# Altium footprint library OT Library.PcbLib: 396 footprints (part 13 of 25)
Each footprint in its own frame and in the unit in brackets; x right, y up, seen from the top. Pads: shape width x height; smd on the part's side, far side on the other; paste and mask are expansions set on the pad; w line width, h text height; cw(c..) or ccw(c..) is an arc to the next point about the centre after c.
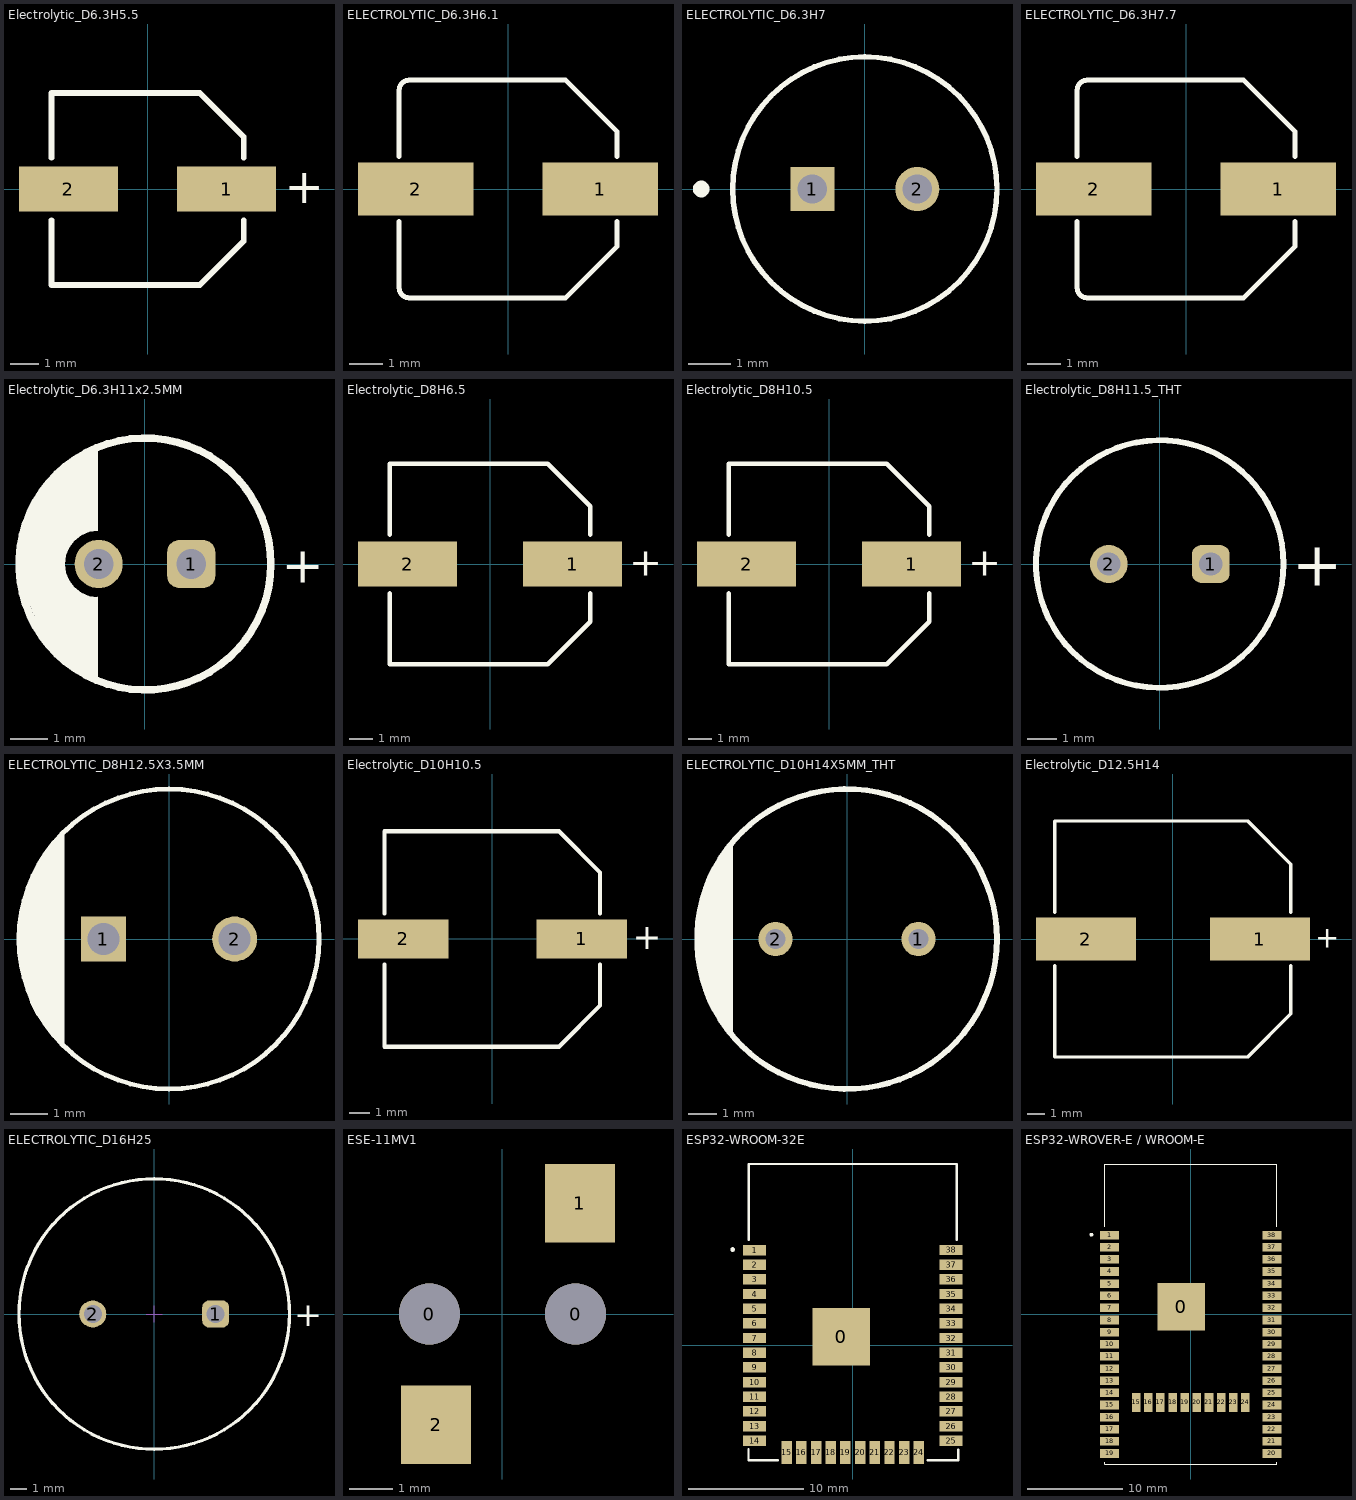
[diagram p12: the footprints below, top view; thin cyan lines are the x and y axes]

## Electrolytic_D6.3H5.5 [mm] "Aluminium Electrolytic V-Chip SMT Capacitors, 6.3x5.5mm"
height 5.5
pads (2):
  rect 3.5x1.6 smd: 1(2.8,0) 2(-2.8,0)
Top Overlay:
  lines w0.2: -3.4,-1.1 -3.4,-3.4 1.85,-3.4 3.4,-1.85 3.4,-1.1 ; -3.4,1.1 -3.4,3.4 1.85,3.4 3.4,1.85 3.4,1.1
  text "+" at 4.85,-0.5 h1.22
3D body: height 5.5, standoff 0, extent -3.65,-3.3 3.65,3.3

## ELECTROLYTIC_D6.3H6.1 [mm] "Aluminium Electrolytic V-Chip SMT Capacitors, 6.3x6.1mm"
height 6.1
pads (2):
  rect 3.5x1.6 smd: 1(2.8,0) 2(-2.8,0)
Top Overlay:
  lines w0.15: -3.3,-3 ccw(c-3,-3) -3,-3.3 1.75,-3.3 3.3,-1.75 3.3,-0.98 ; -3.3,-2.99 -3.3,-0.98 ; -3.3,0.98 -3.3,2.99 ; -3.3,3 cw(c-3,3) -3,3.3 1.75,3.3 3.3,1.75 3.3,0.98
3D body: height 6.1, standoff 0, extent -3.65,-3.3 3.65,3.3

## ELECTROLYTIC_D6.3H7 [mm] "Lead Spacing 2.5mm"
height 7
pads (2):
  rect 1.05x1.05 hole 0.7: 1(-1.25,0)
  round 1.05 hole 0.7: 2(1.25,0)
Top Overlay:
  circle w0.127: c0,0 r3.15
  circle w0.2: c-3.9,0 r0.1
3D body: height 7, standoff -17, extent -3.15,-3.148 3.15,3.148

## ELECTROLYTIC_D6.3H7.7 [mm] "Aluminium Electrolytic V-Chip SMT Capacitors, 6.3x7.7mm"
height 6.1
pads (2):
  rect 3.5x1.6 smd: 1(2.8,0) 2(-2.8,0)
Top Overlay:
  lines w0.15: -3.3,-3 ccw(c-3,-3) -3,-3.3 1.75,-3.3 3.3,-1.75 3.3,-0.98 ; -3.3,-2.99 -3.3,-0.98 ; -3.3,0.98 -3.3,2.99 ; -3.3,3 cw(c-3,3) -3,3.3 1.75,3.3 3.3,1.75 3.3,0.98
3D body: height 7.7, standoff 0, extent -3.65,-3.3 3.65,3.3

## Electrolytic_D6.3H11x2.5MM [mm] "Aluminum Electrolytic Capacitors, 6.3x11mm"
height 11
pads (2):
  rrect50% 1.3x1.3 hole 0.8: 1(1.25,0)
  round 1.3 hole 0.8: 2(-1.25,0)
Top Overlay:
  circle w0.2: c0,0 r3.4
  region: -1.27,3.175 -1.27,0.897 -1.502,0.866 -1.718,0.777 -1.904,0.634 -2.047,0.448 -2.136,0.232 -2.167,0 -2.136,-0.232 -2.047,-0.448 -1.904,-0.634 -1.718,-0.777 -1.502,-0.866 -1.27,-0.897 -1.27,-0.889 -1.27,-3.175 -2.667,-2.159 -3.302,-0.635 -3.302,0.508 -3.048,1.524 -2.286,2.54
  text "+" at 3.7,-0.5 h1
3D body: height 11.31, standoff -19.91, extent -3.14,-3.15 3.15,3.15

## Electrolytic_D8H6.5 [mm] "Aluminium Electrolytic V-Chip SMT Capacitors, 8x6.5mm"
height 6.5
pads (2):
  rect 4.2x1.9 smd: 1(3.5,0) 2(-3.5,0)
Top Overlay:
  lines w0.2: -4.25,-1.25 -4.25,-4.25 2.45,-4.25 4.25,-2.45 4.25,-1.25 ; -4.25,1.25 -4.25,4.25 2.45,4.25 4.25,2.45 4.25,1.25
  text "+" at 5.9,-0.5 h1.22
3D body: height 6.45, standoff -0.05, extent -4.5,-4.15 4.5,4.15

## Electrolytic_D8H10.5 [mm] "Aluminium Electrolytic V-Chip SMT Capacitors, 8x10.5mm"
height 10.5
pads (2):
  rect 4.2x1.9 smd: 1(3.5,0) 2(-3.5,0)
Top Overlay:
  lines w0.2: -4.25,-1.25 -4.25,-4.25 2.45,-4.25 4.25,-2.45 4.25,-1.25 ; -4.25,1.25 -4.25,4.25 2.45,4.25 4.25,2.45 4.25,1.25
  text "+" at 5.9,-0.5 h1.22
3D body: height 10.5, standoff 0, extent -4.5,-4.15 4.5,4.15

## Electrolytic_D8H11.5_THT [mm] "Aluminum Electrolytic Capacitors, 8x11.5mm"
height 11.5
pads (2):
  rrect50% 1.3x1.3 hole 0.8: 1(1.75,0)
  round 1.3 hole 0.8: 2(-1.75,0)
Top Overlay:
  circle w0.2: c0,0 r4.25
  text "+" at 4.55,-0.75 h1.5
3D body: height 11.81, standoff -19.91, extent -3.99,-4 4,3.999

## ELECTROLYTIC_D8H12.5X3.5MM [mm]
pads (2):
  rect 1.2x1.2 / inner round 1.2 / far side rect 1.2x1.2 hole 0.85: 1(-1.75,0)
  round 1.2 hole 0.85: 2(1.75,0)
Top Overlay:
  circle w0.127: c0,0 r4
  region: -3.765,1.226 -3.875,1.082 -3.945,0.915 -3.968,0.736 -3.962,0.736 -3.97,-0.574 -3.942,-0.64 -3.937,-0.635 -3.945,-0.753 -3.912,-0.922 -3.816,-1.066 -3.81,-1.06
  region: -3.048,2.54 -3.075,2.531 -3.392,2.144 -3.628,1.703 -3.773,1.224 -3.822,0.726 -3.81,0.726 -3.818,-1.06 -3.785,-1.4 -3.686,-1.727 -3.525,-2.028 -3.308,-2.292 -3.302,-2.286
  region: -2.794,2.794 -2.794,-2.794 -3.302,-2.286 -3.302,2.286
3D body: height 11.5, standoff -17, extent -4,-4 4,4

## Electrolytic_D10H10.5 [mm] "Aluminium Electrolytic V-Chip SMT Capacitors, 10x10.5mm"
height 10.5
pads (2):
  rect 4.4x1.9 smd: 1(4.35,0) 2(-4.35,0)
Top Overlay:
  lines w0.2: -5.25,-1.25 -5.25,-5.25 3.25,-5.25 5.25,-3.25 5.25,-1.25 ; -5.25,1.25 -5.25,5.25 3.25,5.25 5.25,3.25 5.25,1.25
  text "+" at 6.85,-0.5 h1.22
3D body: height 10.5, standoff 0, extent -5.5,-5.15 5.5,5.15

## ELECTROLYTIC_D10H14X5MM_THT [mm]
pads (2):
  round 1.2 hole 0.7: 1(2.5,0) 2(-2.5,0)
Top Overlay:
  circle w0.2: c0,0 r5.25
  region: -4,-3.312 -4,3.375 -4.616,2.45 -5.15,0.85 -5.15,-0.875 -4.675,-2.3
3D body: height 14.11, standoff -4.27, extent -5.271,-5.242 5.243,5.242

## Electrolytic_D12.5H14 [mm] "Aluminium Electrolytic V-Chip SMT Capacitors, 12.5x14mm"
height 14
pads (2):
  rect 5.8x2.5 smd: 1(5.05,0) 2(-5.05,0)
Top Overlay:
  lines w0.2: -6.85,-1.55 -6.85,-6.85 4.35,-6.85 6.85,-4.35 6.85,-1.55 ; -6.85,1.55 -6.85,6.85 4.35,6.85 6.85,4.35 6.85,1.55
  text "+" at 8.25,-0.5 h1.22
3D body: height 14, standoff 0, extent -7.1,-6.725 7.1,6.725

## ELECTROLYTIC_D16H25 [mm] "Aluminum Electrolytic Capacitors, 16x25mm"
height 25
pads (2):
  rrect50% 1.65x1.65 hole 1.1: 1(3.75,0)
  round 1.65 hole 1.1: 2(-3.75,0)
Top Overlay:
  circle w0.2: c0,0 r8.25
  text "+" at 8.55,-0.75 h1.5
Mechanical 17:
  lines w0.05: -0.5,0 0.5,0 ; 0,-0.5 0,0.5
3D body: height 25.31, standoff -19.91, extent -7.99,-8 8,7.999

## ESE-11MV1 [mm]
pads (4):
  round 1.4 hole 1.4: 0(-1.675,0) 0(1.675,0)
  rect 1.6x1.8 smd: 1(1.778,2.54) 2(-1.524,-2.54)
3D body: height 8.5, standoff -1, extent -3.2,-2.7 3.2,2.7

## ESP32-WROOM-32E [mm]
pads (39):
  rect 5x5 smd paste-3 mask+0: 0(-1,0.76)
  rect 2x0.9 smd: 1(-8.5,8.25) 2(-8.5,6.99) 3(-8.5,5.72) 4(-8.5,4.45) 5(-8.5,3.18) 6(-8.5,1.91) 7(-8.5,0.64) 8(-8.5,-0.63) 9(-8.5,-1.9) 10(-8.5,-3.17) 11(-8.5,-4.44) 12(-8.5,-5.71) 13(-8.5,-6.98) 14(-8.5,-8.25) 25(8.5,-8.25) 26(8.5,-6.98) 27(8.5,-5.71) 28(8.5,-4.44) 29(8.5,-3.17) 30(8.5,-1.9) 31(8.5,-0.63) 32(8.5,0.64) 33(8.5,1.91) 34(8.5,3.18) 35(8.5,4.45) 36(8.5,5.72) 37(8.5,6.99) 38(8.5,8.26)
  rect 0.9x2 smd: 15(-5.715,-9.26) 16(-4.445,-9.26) 17(-3.175,-9.26) 18(-1.905,-9.26) 19(-0.635,-9.26) 20(0.635,-9.26) 21(1.905,-9.26) 22(3.175,-9.26) 23(4.445,-9.26) 24(5.715,-9.26)
Top Overlay:
  circle w0.2: c-10.4,8.3 r0.1
  lines w0.2: -9.017,-8.992 -9.017,-9.931 -6.477,-9.931 ; -9,9.13 -9,15.7 9,15.7 9,9.13 ; 6.477,-9.931 9.119,-9.931 9.119,-9.017
Top Paste:
  region: 1.5,-1.74 0.17,-1.74 0.17,-0.41 1.5,-0.41
  region: -0.335,-1.74 -1.665,-1.74 -1.665,-0.41 -0.335,-0.41
  region: -2.17,-1.74 -3.5,-1.74 -3.5,-0.41 -2.17,-0.41
  region: -2.17,1.93 -3.5,1.93 -3.5,3.26 -2.17,3.26
  region: -0.335,1.93 -1.665,1.93 -1.665,3.26 -0.335,3.26
  region: 1.5,1.93 0.17,1.93 0.17,3.26 1.5,3.26
  region: 1.5,0.095 0.17,0.095 0.17,1.425 1.5,1.425
  region: -2.17,0.095 -3.5,0.095 -3.5,1.425 -2.17,1.425
  region: -0.335,0.095 -1.665,0.095 -1.665,1.425 -0.335,1.425
Top Solder:
  region: 1.5,-1.74 0.17,-1.74 0.17,-0.41 1.5,-0.41
  region: -0.335,-1.74 -1.665,-1.74 -1.665,-0.41 -0.335,-0.41
  region: -2.17,-1.74 -3.5,-1.74 -3.5,-0.41 -2.17,-0.41
  region: -2.17,1.93 -3.5,1.93 -3.5,3.26 -2.17,3.26
  region: -0.335,1.93 -1.665,1.93 -1.665,3.26 -0.335,3.26
  region: 1.5,1.93 0.17,1.93 0.17,3.26 1.5,3.26
  region: 1.5,0.095 0.17,0.095 0.17,1.425 1.5,1.425
  region: -2.17,0.095 -3.5,0.095 -3.5,1.425 -2.17,1.425
  region: -0.335,0.095 -1.665,0.095 -1.665,1.425 -0.335,1.425
3D body: height 3.25, standoff 0, extent -8.949,-9.854 9.051,15.646

## ESP32-WROVER-E / WROOM-E [mm]
pads (49):
  rect 5x5 smd paste-3 mask+0: 0(-1,0.76)
  rect 2x0.9 smd: 1(-8.5,8.25) 2(-8.5,6.99) 3(-8.5,5.72) 4(-8.5,4.45) 5(-8.5,3.18) 6(-8.5,1.91) 7(-8.5,0.64) 8(-8.5,-0.63) 9(-8.5,-1.9) 10(-8.5,-3.17) 11(-8.5,-4.44) 12(-8.5,-5.71) 13(-8.5,-6.98) 14(-8.5,-8.25) 15(-8.5,-9.52) 16(-8.5,-10.79) 17(-8.5,-12.06) 18(-8.5,-13.33) 19(-8.5,-14.6) 20(8.5,-14.6) 21(8.5,-13.33) 22(8.5,-12.06) 23(8.5,-10.79) 24(8.5,-9.52) 25(8.5,-8.25) 26(8.5,-6.98) 27(8.5,-5.71) 28(8.5,-4.44) 29(8.5,-3.17) 30(8.5,-1.9) 31(8.5,-0.63) 32(8.5,0.64) 33(8.5,1.91) 34(8.5,3.18) 35(8.5,4.45) 36(8.5,5.72) 37(8.5,6.99) 38(8.5,8.26)
  rect 0.9x2 smd: 15(-5.715,-9.26) 16(-4.445,-9.26) 17(-3.175,-9.26) 18(-1.905,-9.26) 19(-0.635,-9.26) 20(0.635,-9.26) 21(1.905,-9.26) 22(3.175,-9.26) 23(4.445,-9.26) 24(5.715,-9.26)
Top Overlay:
  circle w0.2: c-10.4,8.3 r0.1
  lines w0.127: -9,-15.5 -9,-15.7 9,-15.7 9,-15.5 ; -9,9.13 -9,15.7 9,15.7 9,9.13
Top Paste:
  region: 1.5,-1.74 0.17,-1.74 0.17,-0.41 1.5,-0.41
  region: -0.335,-1.74 -1.665,-1.74 -1.665,-0.41 -0.335,-0.41
  region: -2.17,-1.74 -3.5,-1.74 -3.5,-0.41 -2.17,-0.41
  region: -2.17,1.93 -3.5,1.93 -3.5,3.26 -2.17,3.26
  region: -0.335,1.93 -1.665,1.93 -1.665,3.26 -0.335,3.26
  region: 1.5,1.93 0.17,1.93 0.17,3.26 1.5,3.26
  region: 1.5,0.095 0.17,0.095 0.17,1.425 1.5,1.425
  region: -2.17,0.095 -3.5,0.095 -3.5,1.425 -2.17,1.425
  region: -0.335,0.095 -1.665,0.095 -1.665,1.425 -0.335,1.425
Top Solder:
  region: 1.5,-1.74 0.17,-1.74 0.17,-0.41 1.5,-0.41
  region: -0.335,-1.74 -1.665,-1.74 -1.665,-0.41 -0.335,-0.41
  region: -2.17,-1.74 -3.5,-1.74 -3.5,-0.41 -2.17,-0.41
  region: -2.17,1.93 -3.5,1.93 -3.5,3.26 -2.17,3.26
  region: -0.335,1.93 -1.665,1.93 -1.665,3.26 -0.335,3.26
  region: 1.5,1.93 0.17,1.93 0.17,3.26 1.5,3.26
  region: 1.5,0.095 0.17,0.095 0.17,1.425 1.5,1.425
  region: -2.17,0.095 -3.5,0.095 -3.5,1.425 -2.17,1.425
  region: -0.335,0.095 -1.665,0.095 -1.665,1.425 -0.335,1.425
3D body: height 3.3, standoff 0, extent -9,-16.2 9,15.2